# Altium schematic symbol library TI Power Management Shunt Voltage Reference.SchLib: 1526 symbols (part 12 of 18) (continued)
## TL1431QD
designator U?
Precision Adjustable (Programmable) Shunt Reference, 23 ppm / degC, 100 mA, -40 to 125 degC, 8-pin SOIC (D), Green (RoHS & no Sb/Br); Manufacturer: Texas Instruments; PartNumber: TL1431QD; Initial Accuracy @ 25/deg C(%): 0.4; Iout/Iz(Max)(mA): 100; Min Iz for Regulation(uA): 1000; Rating: Catalog; SubFamily: Shunt Voltage Reference; Temp Coeff(Max)(ppm/ degree C): 114; Temp Coeff(Typ)(ppm/ degree C): 23; VO Adj(Max)(V): 36; VO Adj(Min)(V): 2.5; DatasheetVersion: SLVS062M; PackageVersion: 4040047-3/M; PackageReference: D8; PackageDescription: 8-Pin Plastic Small Outline, Body 4.9 x 3.9 mm, Pitch 1.27 mm; Supplier 1: Digi-Key; Supplier Part Number 1: 296-10131-5-ND; Supplier 2: Farnell; Supplier Part Number 2: 1652377; Supplier 3: Newark; Supplier Part Number 3: 35K1266; Supplier 4: Mouser; Supplier Part Number 4: 595-TL1431QD; Eco-Plan: Green (RoHS & no Sb/Br); Mounting Technology: Surface Mount; Code_JEDEC: MS-012; ComponentLink1Description: Manufacturer URL; ComponentLink1URL: http://www.ti.com/; ComponentLink2Description: Datasheet; ComponentLink2URL: http://www.ti.com/general/docs/lit/getliterature.tsp?genericPartNumber=TL1431&fileType=pdf; ComponentLink3Description: Package Specification; ComponentLink3URL: http://www.ti.com/litv/pdf/msoi002j
footprint TI-D8_N (SOIC, 8-Leads, Body 4.9x3.9mm, Pitch 1.27mm, IPC Medium Density)
part A pins: 1 CATHODE, 2 ANODE, 3 ANODE, 6 ANODE, 7 ANODE, 8 REF (in)
part B pins: 4 NC, 5 NC

## TL1431QDG4
designator U?
Precision Adjustable (Programmable) Shunt Reference, 23 ppm / degC, 100 mA, -40 to 125 degC, 8-pin SOIC (D), Green (RoHS & no Sb/Br); Manufacturer: Texas Instruments; PartNumber: TL1431QDG4; Initial Accuracy @ 25/deg C(%): 0.4; Iout/Iz(Max)(mA): 100; Min Iz for Regulation(uA): 1000; Rating: Catalog; SubFamily: Shunt Voltage Reference; Temp Coeff(Max)(ppm/ degree C): 114; Temp Coeff(Typ)(ppm/ degree C): 23; VO Adj(Max)(V): 36; VO Adj(Min)(V): 2.5; DatasheetVersion: SLVS062M; PackageVersion: 4040047-3/M; PackageReference: D8; PackageDescription: 8-Pin Plastic Small Outline, Body 4.9 x 3.9 mm, Pitch 1.27 mm; Supplier 1: Digi-Key; Supplier Part Number 1: 296-22044-5-ND; Supplier 2: Newark; Supplier Part Number 2: 54M7381; Supplier 3: Mouser; Supplier Part Number 3: 595-TL1431QDG4; Eco-Plan: Green (RoHS & no Sb/Br); Mounting Technology: Surface Mount; Code_JEDEC: MS-012; ComponentLink1Description: Manufacturer URL; ComponentLink1URL: http://www.ti.com/; ComponentLink2Description: Datasheet; ComponentLink2URL: http://www.ti.com/general/docs/lit/getliterature.tsp?genericPartNumber=TL1431&fileType=pdf; ComponentLink3Description: Package Specification; ComponentLink3URL: http://www.ti.com/litv/pdf/msoi002j
footprint TI-D8_N (SOIC, 8-Leads, Body 4.9x3.9mm, Pitch 1.27mm, IPC Medium Density)
part A pins: 1 CATHODE, 2 ANODE, 3 ANODE, 6 ANODE, 7 ANODE, 8 REF (in)
part B pins: 4 NC, 5 NC

## TL1431QDR
designator U?
Precision Adjustable (Programmable) Shunt Reference, 23 ppm / degC, 100 mA, -40 to 125 degC, 8-pin SOIC (D), Green (RoHS & no Sb/Br); Manufacturer: Texas Instruments; PartNumber: TL1431QDR; Initial Accuracy @ 25/deg C(%): 0.4; Iout/Iz(Max)(mA): 100; Min Iz for Regulation(uA): 1000; Rating: Catalog; SubFamily: Shunt Voltage Reference; Temp Coeff(Max)(ppm/ degree C): 114; Temp Coeff(Typ)(ppm/ degree C): 23; VO Adj(Max)(V): 36; VO Adj(Min)(V): 2.5; DatasheetVersion: SLVS062M; PackageVersion: 4040047-3/M; PackageReference: D8; PackageDescription: 8-Pin Plastic Small Outline, Body 4.9 x 3.9 mm, Pitch 1.27 mm; Supplier 1: Digi-Key; Supplier Part Number 1: 296-17021-2-ND; Supplier 2: Digi-Key; Supplier Part Number 2: 296-17021-1-ND; Supplier 3: Digi-Key; Supplier Part Number 3: 296-17021-6-ND; Supplier 4: Newark; Supplier Part Number 4: 76C9144; Supplier 5: Mouser; Supplier Part Number 5: 595-TL1431QDR; Eco-Plan: Green (RoHS & no Sb/Br); Mounting Technology: Surface Mount; Code_JEDEC: MS-012; ComponentLink1Description: Manufacturer URL; ComponentLink1URL: http://www.ti.com/; ComponentLink2Description: Datasheet; ComponentLink2URL: http://www.ti.com/general/docs/lit/getliterature.tsp?genericPartNumber=TL1431&fileType=pdf; ComponentLink3Description: Package Specification; ComponentLink3URL: http://www.ti.com/litv/pdf/msoi002j
footprint TI-D8_N (SOIC, 8-Leads, Body 4.9x3.9mm, Pitch 1.27mm, IPC Medium Density)
part A pins: 1 CATHODE, 2 ANODE, 3 ANODE, 6 ANODE, 7 ANODE, 8 REF (in)
part B pins: 4 NC, 5 NC

## TL1431QDREP
designator U?
Enhanced Product Precision Adjustable (Programmable) Shunt Reference, 100 mA, -40 to 125 degC, 8-pin SOIC (D), Green (RoHS & no Sb/Br); Manufacturer: Texas Instruments; PartNumber: TL1431QDREP; Initial Accuracy @ 25/deg C(%): 0.4; Iout/Iz(Max)(mA): 100; Min Iz for Regulation(uA): 1000; Rating: HiRel Enhanced Product; SubFamily: Shunt Voltage Reference; VO Adj(Max)(V): 36; VO Adj(Min)(V): 2.5; DatasheetVersion: SLVS529C; PackageVersion: 4040047-3/M; PackageReference: D8; PackageDescription: 8-Pin Plastic Small Outline, Body 4.9 x 3.9 mm, Pitch 1.27 mm; Supplier 1: Digi-Key; Supplier Part Number 1: 296-18135-2-ND; Supplier 2: Digi-Key; Supplier Part Number 2: 296-18135-1-ND; Supplier 3: Digi-Key; Supplier Part Number 3: 296-18135-6-ND; Supplier 4: Newark; Supplier Part Number 4: 46M0971; Supplier 5: Mouser; Supplier Part Number 5: 595-TL1431QDREP; Eco-Plan: Green (RoHS & no Sb/Br); Mounting Technology: Surface Mount; Code_JEDEC: MS-012; ComponentLink1Description: Manufacturer URL; ComponentLink1URL: http://www.ti.com/; ComponentLink2Description: Datasheet; ComponentLink2URL: http://www.ti.com/general/docs/lit/getliterature.tsp?genericPartNumber=TL1431-EP&fileType=pdf; ComponentLink3Description: Package Specification; ComponentLink3URL: http://www.ti.com/litv/pdf/msoi002j; ComponentLink4Description: URL Link1; ComponentLink4URL: Samples URL:http://www.ti.com/product/tl1431-ep
footprint TI-D8_N (SOIC, 8-Leads, Body 4.9x3.9mm, Pitch 1.27mm, IPC Medium Density)
part A pins: 1 CATHODE, 2 ANODE, 3 ANODE, 6 ANODE, 7 ANODE, 8 REF (in)
part B pins: 4 NC, 5 NC

## TL1431QDRG4
designator U?
Precision Adjustable (Programmable) Shunt Reference, 23 ppm / degC, 100 mA, -40 to 125 degC, 8-pin SOIC (D), Green (RoHS & no Sb/Br); Manufacturer: Texas Instruments; PartNumber: TL1431QDRG4; Initial Accuracy @ 25/deg C(%): 0.4; Iout/Iz(Max)(mA): 100; Min Iz for Regulation(uA): 1000; Rating: Catalog; SubFamily: Shunt Voltage Reference; Temp Coeff(Max)(ppm/ degree C): 114; Temp Coeff(Typ)(ppm/ degree C): 23; VO Adj(Max)(V): 36; VO Adj(Min)(V): 2.5; DatasheetVersion: SLVS062M; PackageVersion: 4040047-3/M; PackageReference: D8; PackageDescription: 8-Pin Plastic Small Outline, Body 4.9 x 3.9 mm, Pitch 1.27 mm; Supplier 1: Digi-Key; Supplier Part Number 1: 296-31943-2-ND; Supplier 2: Digi-Key; Supplier Part Number 2: 296-31943-1-ND; Supplier 3: Digi-Key; Supplier Part Number 3: 296-31943-6-ND; Supplier 4: Newark; Supplier Part Number 4: 54M7382; Supplier 5: Mouser; Supplier Part Number 5: 595-TL1431QDRG4; Eco-Plan: Green (RoHS & no Sb/Br); Mounting Technology: Surface Mount; Code_JEDEC: MS-012; ComponentLink1Description: Manufacturer URL; ComponentLink1URL: http://www.ti.com/; ComponentLink2Description: Datasheet; ComponentLink2URL: http://www.ti.com/general/docs/lit/getliterature.tsp?genericPartNumber=TL1431&fileType=pdf; ComponentLink3Description: Package Specification; ComponentLink3URL: http://www.ti.com/litv/pdf/msoi002j
footprint TI-D8_N (SOIC, 8-Leads, Body 4.9x3.9mm, Pitch 1.27mm, IPC Medium Density)
part A pins: 1 CATHODE, 2 ANODE, 3 ANODE, 6 ANODE, 7 ANODE, 8 REF (in)
part B pins: 4 NC, 5 NC

## TL1431QDRG4Q1
designator U?
Automotive Catalog Precision Adjustable (Programmable) Shunt Reference, 100 mA, -40 to 125 degC, 8-pin SOIC (D), Green (RoHS & no Sb/Br); Manufacturer: Texas Instruments; PartNumber: TL1431QDRG4Q1; Initial Accuracy @ 25/deg C(%): 0.4; Iout/Iz(Max)(mA): 100; Min Iz for Regulation(uA): 1000; SubFamily: Shunt Voltage Reference; VO Adj(Max)(V): 36; VO Adj(Min)(V): 2.5; DatasheetVersion: SLVS534B; PackageVersion: 4040047-3/M; PackageReference: D8; PackageDescription: 8-Pin Plastic Small Outline, Body 4.9 x 3.9 mm, Pitch 1.27 mm; Supplier 1: Digi-Key; Supplier Part Number 1: TL1431QDRG4Q1-ND; Supplier 2: Mouser; Supplier Part Number 2: 595-TL1431QDRG4Q1; Eco-Plan: Green (RoHS & no Sb/Br); Rating: Automotive; Mounting Technology: Surface Mount; Code_JEDEC: MS-012; ComponentLink1Description: Manufacturer URL; ComponentLink1URL: http://www.ti.com/; ComponentLink2Description: Datasheet; ComponentLink2URL: http://www.ti.com/general/docs/lit/getliterature.tsp?genericPartNumber=TL1431-Q1&fileType=pdf; ComponentLink3Description: Package Specification; ComponentLink3URL: http://www.ti.com/litv/pdf/msoi002j
footprint TI-D8_N (SOIC, 8-Leads, Body 4.9x3.9mm, Pitch 1.27mm, IPC Medium Density)
part A pins: 1 CATHODE, 2 ANODE, 3 ANODE, 6 ANODE, 7 ANODE, 8 REF (in)
part B pins: 4 NC, 5 NC

## TL1431QDRQ1
designator U?
Automotive Catalog Precision Adjustable (Programmable) Shunt Reference, 100 mA, -40 to 125 degC, 8-pin SOIC (D), Green (RoHS & no Sb/Br); Manufacturer: Texas Instruments; PartNumber: TL1431QDRQ1; Initial Accuracy @ 25/deg C(%): 0.4; Iout/Iz(Max)(mA): 100; Min Iz for Regulation(uA): 1000; SubFamily: Shunt Voltage Reference; VO Adj(Max)(V): 36; VO Adj(Min)(V): 2.5; DatasheetVersion: SLVS534B; PackageVersion: 4040047-3/M; PackageReference: D8; PackageDescription: 8-Pin Plastic Small Outline, Body 4.9 x 3.9 mm, Pitch 1.27 mm; Supplier 1: Digi-Key; Supplier Part Number 1: 296-21093-2-ND; Supplier 2: Digi-Key; Supplier Part Number 2: 296-21093-1-ND; Supplier 3: Digi-Key; Supplier Part Number 3: 296-21093-6-ND; Supplier 4: Newark; Supplier Part Number 4: 28K5683; Supplier 5: Mouser; Supplier Part Number 5: 595-TL1431QDRQ1; Eco-Plan: Green (RoHS & no Sb/Br); Rating: Automotive; Mounting Technology: Surface Mount; Code_JEDEC: MS-012; ComponentLink1Description: Manufacturer URL; ComponentLink1URL: http://www.ti.com/; ComponentLink2Description: Datasheet; ComponentLink2URL: http://www.ti.com/general/docs/lit/getliterature.tsp?genericPartNumber=TL1431-Q1&fileType=pdf; ComponentLink3Description: Package Specification; ComponentLink3URL: http://www.ti.com/litv/pdf/msoi002j
footprint TI-D8_N (SOIC, 8-Leads, Body 4.9x3.9mm, Pitch 1.27mm, IPC Medium Density)
part A pins: 1 CATHODE, 2 ANODE, 3 ANODE, 6 ANODE, 7 ANODE, 8 REF (in)
part B pins: 4 NC, 5 NC

## TL1431QPWR
designator U?
Precision Adjustable (Programmable) Shunt Reference, 23 ppm / degC, 100 mA, -40 to 125 degC, 8-pin TSSOP (PW), Green (RoHS & no Sb/Br); Manufacturer: Texas Instruments; PartNumber: TL1431QPWR; Initial Accuracy @ 25/deg C(%): 0.4; Iout/Iz(Max)(mA): 100; Min Iz for Regulation(uA): 1000; Rating: Catalog; SubFamily: Shunt Voltage Reference; Temp Coeff(Max)(ppm/ degree C): 114; Temp Coeff(Typ)(ppm/ degree C): 23; VO Adj(Max)(V): 36; VO Adj(Min)(V): 2.5; DatasheetVersion: SLVS062M; PackageVersion: 4040064-2/G; PackageReference: PW8; PackageDescription: 8-Pin Plastic Small Outline, Body 4.4 x 3 mm, Pitch 0.65 mm; Supplier 1: Digi-Key; Supplier Part Number 1: TL1431QPWR-ND; Supplier 2: Mouser; Supplier Part Number 2: 595-TL1431QPWR; Eco-Plan: Green (RoHS & no Sb/Br); Mounting Technology: Surface Mount; Code_JEDEC: MO-153; ComponentLink1Description: Manufacturer URL; ComponentLink1URL: http://www.ti.com/; ComponentLink2Description: Datasheet; ComponentLink2URL: http://www.ti.com/general/docs/lit/getliterature.tsp?genericPartNumber=TL1431&fileType=pdf; ComponentLink3Description: Package Specification; ComponentLink3URL: http://www.ti.com/litv/pdf/mtss001d
footprint TI-PW8_N (SOP, 8-Leads, Body 4.4x3mm, Pitch 0.65mm, IPC Medium Density)
part A pins: 1 CATHODE, 6 ANODE, 8 REF (in)
part B pins: 2 NC "No internal connection", 3 NC "No internal connection", 4 NC "No internal connection", 5 NC "No internal connection", 7 NC "No internal connection"

## TL1431QPWRG4
designator U?
Precision Adjustable (Programmable) Shunt Reference, 23 ppm / degC, 100 mA, -40 to 125 degC, 8-pin TSSOP (PW), Green (RoHS & no Sb/Br); Manufacturer: Texas Instruments; PartNumber: TL1431QPWRG4; Initial Accuracy @ 25/deg C(%): 0.4; Iout/Iz(Max)(mA): 100; Min Iz for Regulation(uA): 1000; Rating: Catalog; SubFamily: Shunt Voltage Reference; Temp Coeff(Max)(ppm/ degree C): 114; Temp Coeff(Typ)(ppm/ degree C): 23; VO Adj(Max)(V): 36; VO Adj(Min)(V): 2.5; DatasheetVersion: SLVS062M; PackageVersion: 4040064-2/G; PackageReference: PW8; PackageDescription: 8-Pin Plastic Small Outline, Body 4.4 x 3 mm, Pitch 0.65 mm; Supplier 1: Digi-Key; Supplier Part Number 1: TL1431QPWRG4-ND; Supplier 2: Mouser; Supplier Part Number 2: 595-TL1431QPWRG4; Eco-Plan: Green (RoHS & no Sb/Br); Mounting Technology: Surface Mount; Code_JEDEC: MO-153; ComponentLink1Description: Manufacturer URL; ComponentLink1URL: http://www.ti.com/; ComponentLink2Description: Datasheet; ComponentLink2URL: http://www.ti.com/general/docs/lit/getliterature.tsp?genericPartNumber=TL1431&fileType=pdf; ComponentLink3Description: Package Specification; ComponentLink3URL: http://www.ti.com/litv/pdf/mtss001d
footprint TI-PW8_N (SOP, 8-Leads, Body 4.4x3mm, Pitch 0.65mm, IPC Medium Density)
part A pins: 1 CATHODE, 6 ANODE, 8 REF (in)
part B pins: 2 NC "No internal connection", 3 NC "No internal connection", 4 NC "No internal connection", 5 NC "No internal connection", 7 NC "No internal connection"

## TL4050A10IDBZR
designator U?
Precision Micropower Shunt Voltage Reference, -40 to 85 degC, 3-pin SOT-23 (DBZ), Green (RoHS & no Sb/Br); Manufacturer: Texas Instruments; PartNumber: TL4050A10IDBZR; Initial Accuracy @ 25/deg C(%): 0.1; Rating: Catalog; VO(V): 10; DatasheetVersion: SLOS486A; PackageVersion: 4203227/B; PackageReference: DBZ3; PackageDescription: 3-Pin Plastic Small Outline, Body 2.92 x 1.3 mm, Pitch 0.95 mm; Supplier 1: Digi-Key; Supplier Part Number 1: 296-22779-2-ND; Supplier 2: Digi-Key; Supplier Part Number 2: 296-22779-1-ND; Supplier 3: Digi-Key; Supplier Part Number 3: 296-22779-6-ND; Supplier 4: Newark; Supplier Part Number 4: 41M5669; Supplier 5: Mouser; Supplier Part Number 5: 595-TL4050A10IDBZR; Eco-Plan: Green (RoHS & no Sb/Br); SubFamily: Shunt Voltage Reference; Mounting Technology: Surface Mount; Code_JEDEC: TO-236; ComponentLink1Description: Manufacturer URL; ComponentLink1URL: http://www.ti.com/; ComponentLink2Description: Datasheet; ComponentLink2URL: http://www.ti.com/general/docs/lit/getliterature.tsp?genericPartNumber=TL4050A10&fileType=pdf; ComponentLink3Description: Package Specification; ComponentLink3URL: http://www.ti.com/litv/pdf/mpds108a
footprint TI-DBZ3_N (SOT23, 3-Leads, Body 2.92x1.3 mm, Pitch 0.95 mm, IPC Medium Density)
pins: 1 CATHODE, 2 ANODE, 3 NC

## TL4050A10IDBZRG4
designator U?
Precision Micropower Shunt Voltage Reference, -40 to 85 degC, 3-pin SOT-23 (DBZ), Green (RoHS & no Sb/Br); Manufacturer: Texas Instruments; PartNumber: TL4050A10IDBZRG4; Initial Accuracy @ 25/deg C(%): 0.1; Rating: Catalog; Temp Coeff(Typ)(ppm/ degree C): 50; VO(V): 10; DatasheetVersion: SLOS486A; PackageVersion: 4203227/B; PackageReference: DBZ3; PackageDescription: 3-Pin Plastic Small Outline, Body 2.92 x 1.3 mm, Pitch 0.95 mm; Supplier 1: Digi-Key; Supplier Part Number 1: TL4050A10IDBZRG4-ND; Supplier 2: Newark; Supplier Part Number 2: 46M0977; Supplier 3: Mouser; Supplier Part Number 3: 595-TL4050A10IDBZRG4; Eco-Plan: Green (RoHS & no Sb/Br); SubFamily: Shunt Voltage Reference; Mounting Technology: Surface Mount; Code_JEDEC: TO-236; ComponentLink1Description: Manufacturer URL; ComponentLink1URL: http://www.ti.com/; ComponentLink2Description: Datasheet; ComponentLink2URL: http://www.ti.com/general/docs/lit/getliterature.tsp?genericPartNumber=TL4050A10&fileType=pdf; ComponentLink3Description: Package Specification; ComponentLink3URL: http://www.ti.com/litv/pdf/mpds108a
footprint TI-DBZ3_N (SOT23, 3-Leads, Body 2.92x1.3 mm, Pitch 0.95 mm, IPC Medium Density)
pins: 1 CATHODE, 2 ANODE, 3 NC

## TL4050A10IDBZT
designator U?
Precision Micropower Shunt Voltage Reference, -40 to 85 degC, 3-pin SOT-23 (DBZ), Green (RoHS & no Sb/Br); Manufacturer: Texas Instruments; PartNumber: TL4050A10IDBZT; Initial Accuracy @ 25/deg C(%): 0.1; Rating: Catalog; Temp Coeff(Typ)(ppm/ degree C): 50; VO(V): 10; DatasheetVersion: SLOS486A; PackageVersion: 4203227/B; PackageReference: DBZ3; PackageDescription: 3-Pin Plastic Small Outline, Body 2.92 x 1.3 mm, Pitch 0.95 mm; Supplier 1: Digi-Key; Supplier Part Number 1: TL4050A10IDBZT-ND; Supplier 2: Farnell; Supplier Part Number 2: 1755349; Supplier 3: Mouser; Supplier Part Number 3: 595-TL4050A10IDBZT; Eco-Plan: Green (RoHS & no Sb/Br); SubFamily: Shunt Voltage Reference; Mounting Technology: Surface Mount; Code_JEDEC: TO-236; ComponentLink1Description: Manufacturer URL; ComponentLink1URL: http://www.ti.com/; ComponentLink2Description: Datasheet; ComponentLink2URL: http://www.ti.com/general/docs/lit/getliterature.tsp?genericPartNumber=TL4050A10&fileType=pdf; ComponentLink3Description: Package Specification; ComponentLink3URL: http://www.ti.com/litv/pdf/mpds108a
footprint TI-DBZ3_N (SOT23, 3-Leads, Body 2.92x1.3 mm, Pitch 0.95 mm, IPC Medium Density)
pins: 1 CATHODE, 2 ANODE, 3 NC

## TL4050A10IDBZTG4
designator U?
Precision Micropower Shunt Voltage Reference, -40 to 85 degC, 3-pin SOT-23 (DBZ), Green (RoHS & no Sb/Br); Manufacturer: Texas Instruments; PartNumber: TL4050A10IDBZTG4; Initial Accuracy @ 25/deg C(%): 0.1; Rating: Catalog; VO(V): 10; DatasheetVersion: SLOS486A; PackageVersion: 4203227/B; PackageReference: DBZ3; PackageDescription: 3-Pin Plastic Small Outline, Body 2.92 x 1.3 mm, Pitch 0.95 mm; Supplier 1: Digi-Key; Supplier Part Number 1: TL4050A10IDBZTG4-ND; Supplier 2: Mouser; Supplier Part Number 2: 595-TL4050A10IDBZTG4; Eco-Plan: Green (RoHS & no Sb/Br); SubFamily: Shunt Voltage Reference; Mounting Technology: Surface Mount; Code_JEDEC: TO-236; ComponentLink1Description: Manufacturer URL; ComponentLink1URL: http://www.ti.com/; ComponentLink2Description: Datasheet; ComponentLink2URL: http://www.ti.com/general/docs/lit/getliterature.tsp?genericPartNumber=TL4050A10&fileType=pdf; ComponentLink3Description: Package Specification; ComponentLink3URL: http://www.ti.com/litv/pdf/mpds108a
footprint TI-DBZ3_N (SOT23, 3-Leads, Body 2.92x1.3 mm, Pitch 0.95 mm, IPC Medium Density)
pins: 1 CATHODE, 2 ANODE, 3 NC

## TL4050A10IDCKR
designator U?
Precision Micropower Shunt Voltage Reference, -40 to 85 degC, 5-pin SC70 (DCK), Green (RoHS & no Sb/Br); Manufacturer: Texas Instruments; PartNumber: TL4050A10IDCKR; Initial Accuracy @ 25/deg C(%): 0.1; Rating: Catalog; Temp Coeff(Typ)(ppm/ degree C): 50; VO(V): 10; DatasheetVersion: SLOS486A; PackageReference: DCK5; PackageDescription: 5-Pin Plastic Small-Outline Package, 2 x 1.3 mm Body, 0.65 mm Pitch, 2.1 mm Lead Span; Supplier 1: Digi-Key; Supplier Part Number 1: 296-22780-2-ND; Supplier 2: Digi-Key; Supplier Part Number 2: 296-22780-1-ND; Supplier 3: Digi-Key; Supplier Part Number 3: 296-22780-6-ND; Supplier 4: Newark; Supplier Part Number 4: 41M5671; Supplier 5: Mouser; Supplier Part Number 5: 595-TL4050A10IDCKR; Eco-Plan: Green (RoHS & no Sb/Br); SubFamily: Shunt Voltage Reference; Mounting Technology: Surface Mount; Code_JEDEC: MO-203; ComponentLink1Description: Manufacturer URL; ComponentLink1URL: http://www.ti.com/; ComponentLink2Description: Datasheet; ComponentLink2URL: http://www.ti.com/general/docs/lit/getliterature.tsp?genericPartNumber=TL4050A10&fileType=pdf; ComponentLink3Description: Package Specification; ComponentLink3URL: http://www.ti.com/litv/pdf/mpds025f
footprint TI-DCK5_N (SOT353, 5-Leads, Body 2x1.3mm, Pitch 0.65mm, Lead Span 2.1mm, IPC Medium Density)
part A pins: 1 ANODE, 3 CATHODE
part B pins: 2 NC, 4 NC, 5 NC

## TL4050A10IDCKRG4
designator U?
Precision Micropower Shunt Voltage Reference, -40 to 85 degC, 5-pin SC70 (DCK), Green (RoHS & no Sb/Br); Manufacturer: Texas Instruments; PartNumber: TL4050A10IDCKRG4; Initial Accuracy @ 25/deg C(%): 0.1; Rating: Catalog; Temp Coeff(Typ)(ppm/ degree C): 50; VO(V): 10; DatasheetVersion: SLOS486A; PackageReference: DCK5; PackageDescription: 5-Pin Plastic Small-Outline Package, 2 x 1.3 mm Body, 0.65 mm Pitch, 2.1 mm Lead Span; Supplier 1: Digi-Key; Supplier Part Number 1: TL4050A10IDCKRG4-ND; Supplier 2: Newark; Supplier Part Number 2: 46M9124; Supplier 3: Mouser; Supplier Part Number 3: 595-TL4050A10IDCKRG4; Eco-Plan: Green (RoHS & no Sb/Br); SubFamily: Shunt Voltage Reference; Mounting Technology: Surface Mount; Code_JEDEC: MO-203; ComponentLink1Description: Manufacturer URL; ComponentLink1URL: http://www.ti.com/; ComponentLink2Description: Datasheet; ComponentLink2URL: http://www.ti.com/general/docs/lit/getliterature.tsp?genericPartNumber=TL4050A10&fileType=pdf; ComponentLink3Description: Package Specification; ComponentLink3URL: http://www.ti.com/litv/pdf/mpds025f
footprint TI-DCK5_N (SOT353, 5-Leads, Body 2x1.3mm, Pitch 0.65mm, Lead Span 2.1mm, IPC Medium Density)
part A pins: 1 ANODE, 3 CATHODE
part B pins: 2 NC, 4 NC, 5 NC

## TL4050A10IDCKT
designator U?
Precision Micropower Shunt Voltage Reference, -40 to 85 degC, 5-pin SC70 (DCK), Green (RoHS & no Sb/Br); Manufacturer: Texas Instruments; PartNumber: TL4050A10IDCKT; Initial Accuracy @ 25/deg C(%): 0.1; Rating: Catalog; Temp Coeff(Typ)(ppm/ degree C): 50; VO(V): 10; DatasheetVersion: SLOS486A; PackageReference: DCK5; PackageDescription: 5-Pin Plastic Small-Outline Package, 2 x 1.3 mm Body, 0.65 mm Pitch, 2.1 mm Lead Span; Supplier 1: Digi-Key; Supplier Part Number 1: TL4050A10IDCKT-ND; Supplier 2: Mouser; Supplier Part Number 2: 595-TL4050A10IDCKT; Eco-Plan: Green (RoHS & no Sb/Br); SubFamily: Shunt Voltage Reference; Mounting Technology: Surface Mount; Code_JEDEC: MO-203; ComponentLink1Description: Manufacturer URL; ComponentLink1URL: http://www.ti.com/; ComponentLink2Description: Datasheet; ComponentLink2URL: http://www.ti.com/general/docs/lit/getliterature.tsp?genericPartNumber=TL4050A10&fileType=pdf; ComponentLink3Description: Package Specification; ComponentLink3URL: http://www.ti.com/litv/pdf/mpds025f
footprint TI-DCK5_N (SOT353, 5-Leads, Body 2x1.3mm, Pitch 0.65mm, Lead Span 2.1mm, IPC Medium Density)
part A pins: 1 ANODE, 3 CATHODE
part B pins: 2 NC, 4 NC, 5 NC

## TL4050A10IDCKTG4
designator U?
Precision Micropower Shunt Voltage Reference, -40 to 85 degC, 5-pin SC70 (DCK), Green (RoHS & no Sb/Br); Manufacturer: Texas Instruments; PartNumber: TL4050A10IDCKTG4; Initial Accuracy @ 25/deg C(%): 0.1; Rating: Catalog; VO(V): 10; DatasheetVersion: SLOS486A; PackageReference: DCK5; PackageDescription: 5-Pin Plastic Small-Outline Package, 2 x 1.3 mm Body, 0.65 mm Pitch, 2.1 mm Lead Span; Supplier 1: Digi-Key; Supplier Part Number 1: TL4050A10IDCKTG4-ND; Supplier 2: Newark; Supplier Part Number 2: 46M9125; Supplier 3: Mouser; Supplier Part Number 3: 595-TL4050A10IDCKTG4; Eco-Plan: Green (RoHS & no Sb/Br); SubFamily: Shunt Voltage Reference; Mounting Technology: Surface Mount; Code_JEDEC: MO-203; ComponentLink1Description: Manufacturer URL; ComponentLink1URL: http://www.ti.com/; ComponentLink2Description: Datasheet; ComponentLink2URL: http://www.ti.com/general/docs/lit/getliterature.tsp?genericPartNumber=TL4050A10&fileType=pdf; ComponentLink3Description: Package Specification; ComponentLink3URL: http://www.ti.com/litv/pdf/mpds025f
footprint TI-DCK5_N (SOT353, 5-Leads, Body 2x1.3mm, Pitch 0.65mm, Lead Span 2.1mm, IPC Medium Density)
part A pins: 1 ANODE, 3 CATHODE
part B pins: 2 NC, 4 NC, 5 NC

## TL4050A10QDBZR
designator U?
Precision Micropower Shunt Voltage Reference, -40 to 125 degC, 3-pin SOT-23 (DBZ), Green (RoHS & no Sb/Br); Manufacturer: Texas Instruments; PartNumber: TL4050A10QDBZR; Rating: Catalog; DatasheetVersion: SLOS486A; PackageVersion: 4203227/B; PackageReference: DBZ3; PackageDescription: 3-Pin Plastic Small Outline, Body 2.92 x 1.3 mm, Pitch 0.95 mm; Supplier 1: Digi-Key; Supplier Part Number 1: 296-22781-2-ND; Supplier 2: Digi-Key; Supplier Part Number 2: 296-22781-1-ND; Supplier 3: Digi-Key; Supplier Part Number 3: 296-22781-6-ND; Supplier 4: Newark; Supplier Part Number 4: 41M5673; Supplier 5: Mouser; Supplier Part Number 5: 595-TL4050A10QDBZR; Eco-Plan: Green (RoHS & no Sb/Br); SubFamily: Shunt Voltage Reference; Mounting Technology: Surface Mount; Code_JEDEC: TO-236; ComponentLink1Description: Manufacturer URL; ComponentLink1URL: http://www.ti.com/; ComponentLink2Description: Datasheet; ComponentLink2URL: http://www.ti.com/general/docs/lit/getliterature.tsp?genericPartNumber=TL4050A10&fileType=pdf; ComponentLink3Description: Package Specification; ComponentLink3URL: http://www.ti.com/litv/pdf/mpds108a
footprint TI-DBZ3_N (SOT23, 3-Leads, Body 2.92x1.3 mm, Pitch 0.95 mm, IPC Medium Density)
pins: 1 CATHODE, 2 ANODE, 3 NC

## TL4050A10QDBZRG4
designator U?
Precision Micropower Shunt Voltage Reference, -40 to 125 degC, 3-pin SOT-23 (DBZ), Green (RoHS & no Sb/Br); Manufacturer: Texas Instruments; PartNumber: TL4050A10QDBZRG4; Rating: Catalog; DatasheetVersion: SLOS486A; PackageVersion: 4203227/B; PackageReference: DBZ3; PackageDescription: 3-Pin Plastic Small Outline, Body 2.92 x 1.3 mm, Pitch 0.95 mm; Supplier 1: Digi-Key; Supplier Part Number 1: TL4050A10QDBZRG4-ND; Supplier 2: Newark; Supplier Part Number 2: 46M0979; Supplier 3: Mouser; Supplier Part Number 3: 595-TL4050A10QDBZRG4; Eco-Plan: Green (RoHS & no Sb/Br); SubFamily: Shunt Voltage Reference; Mounting Technology: Surface Mount; Code_JEDEC: TO-236; ComponentLink1Description: Manufacturer URL; ComponentLink1URL: http://www.ti.com/; ComponentLink2Description: Datasheet; ComponentLink2URL: http://www.ti.com/general/docs/lit/getliterature.tsp?genericPartNumber=TL4050A10&fileType=pdf; ComponentLink3Description: Package Specification; ComponentLink3URL: http://www.ti.com/litv/pdf/mpds108a
footprint TI-DBZ3_N (SOT23, 3-Leads, Body 2.92x1.3 mm, Pitch 0.95 mm, IPC Medium Density)
pins: 1 CATHODE, 2 ANODE, 3 NC

## TL4050A10QDBZT
designator U?
Precision Micropower Shunt Voltage Reference, -40 to 125 degC, 3-pin SOT-23 (DBZ), Green (RoHS & no Sb/Br); Manufacturer: Texas Instruments; PartNumber: TL4050A10QDBZT; Rating: Catalog; DatasheetVersion: SLOS486A; PackageVersion: 4203227/B; PackageReference: DBZ3; PackageDescription: 3-Pin Plastic Small Outline, Body 2.92 x 1.3 mm, Pitch 0.95 mm; Supplier 1: Digi-Key; Supplier Part Number 1: TL4050A10QDBZT-ND; Supplier 2: Mouser; Supplier Part Number 2: 595-TL4050A10QDBZT; Eco-Plan: Green (RoHS & no Sb/Br); SubFamily: Shunt Voltage Reference; Mounting Technology: Surface Mount; Code_JEDEC: TO-236; ComponentLink1Description: Manufacturer URL; ComponentLink1URL: http://www.ti.com/; ComponentLink2Description: Datasheet; ComponentLink2URL: http://www.ti.com/general/docs/lit/getliterature.tsp?genericPartNumber=TL4050A10&fileType=pdf; ComponentLink3Description: Package Specification; ComponentLink3URL: http://www.ti.com/litv/pdf/mpds108a
footprint TI-DBZ3_N (SOT23, 3-Leads, Body 2.92x1.3 mm, Pitch 0.95 mm, IPC Medium Density)
pins: 1 CATHODE, 2 ANODE, 3 NC

## TL4050A10QDBZTG4
designator U?
Precision Micropower Shunt Voltage Reference, -40 to 125 degC, 3-pin SOT-23 (DBZ), Green (RoHS & no Sb/Br); Manufacturer: Texas Instruments; PartNumber: TL4050A10QDBZTG4; Rating: Catalog; DatasheetVersion: SLOS486A; PackageVersion: 4203227/B; PackageReference: DBZ3; PackageDescription: 3-Pin Plastic Small Outline, Body 2.92 x 1.3 mm, Pitch 0.95 mm; Supplier 1: Digi-Key; Supplier Part Number 1: TL4050A10QDBZTG4-ND; Supplier 2: Mouser; Supplier Part Number 2: 595-TL4050A10QDBZTG4; Eco-Plan: Green (RoHS & no Sb/Br); SubFamily: Shunt Voltage Reference; Mounting Technology: Surface Mount; Code_JEDEC: TO-236; ComponentLink1Description: Manufacturer URL; ComponentLink1URL: http://www.ti.com/; ComponentLink2Description: Datasheet; ComponentLink2URL: http://www.ti.com/general/docs/lit/getliterature.tsp?genericPartNumber=TL4050A10&fileType=pdf; ComponentLink3Description: Package Specification; ComponentLink3URL: http://www.ti.com/litv/pdf/mpds108a
footprint TI-DBZ3_N (SOT23, 3-Leads, Body 2.92x1.3 mm, Pitch 0.95 mm, IPC Medium Density)
pins: 1 CATHODE, 2 ANODE, 3 NC

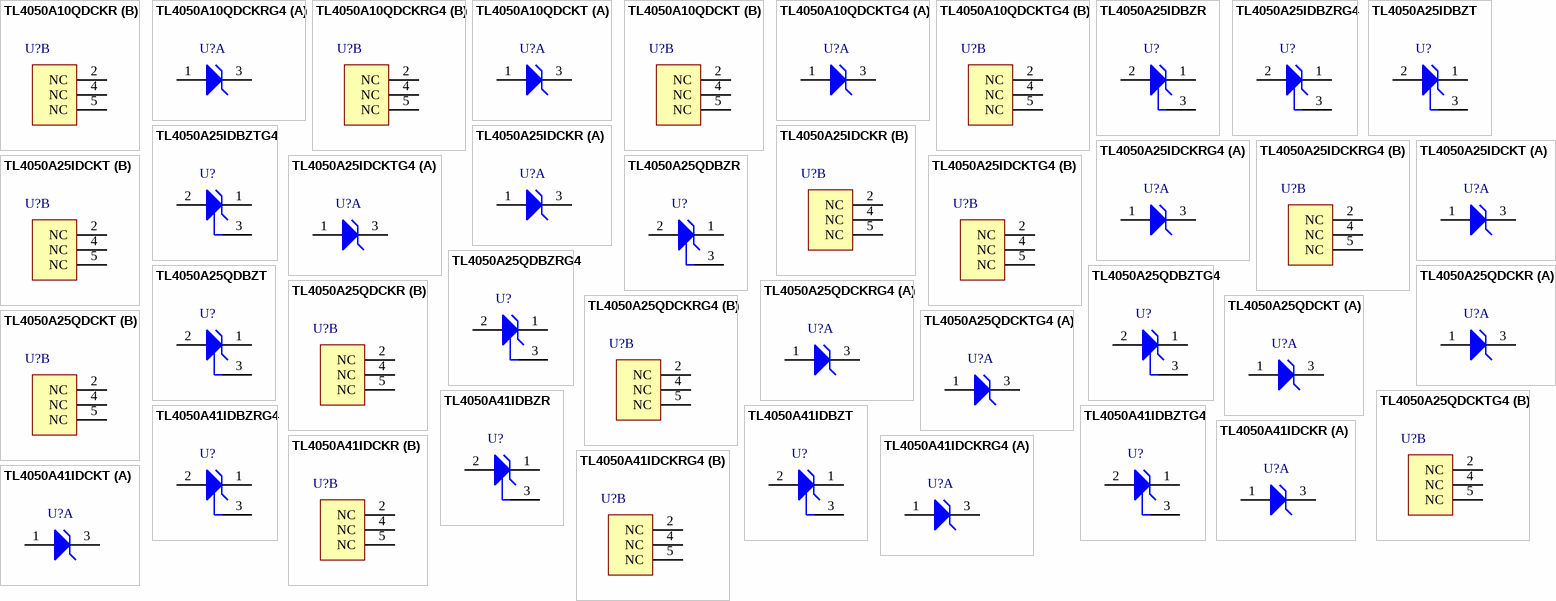
[diagram p37: symbols TL4050A10QDCKR to TL4050A41IDCKT]

## TL4050A10QDCKR
designator U?
Precision Micropower Shunt Voltage Reference, -40 to 125 degC, 5-pin SC70 (DCK), Green (RoHS & no Sb/Br); Manufacturer: Texas Instruments; PartNumber: TL4050A10QDCKR; Rating: Catalog; DatasheetVersion: SLOS486A; PackageReference: DCK5; PackageDescription: 5-Pin Plastic Small-Outline Package, 2 x 1.3 mm Body, 0.65 mm Pitch, 2.1 mm Lead Span; Supplier 1: Digi-Key; Supplier Part Number 1: 296-22782-2-ND; Supplier 2: Digi-Key; Supplier Part Number 2: 296-22782-1-ND; Supplier 3: Digi-Key; Supplier Part Number 3: 296-22782-6-ND; Supplier 4: Newark; Supplier Part Number 4: 41M5675; Supplier 5: Mouser; Supplier Part Number 5: 595-TL4050A10QDCKR; Eco-Plan: Green (RoHS & no Sb/Br); SubFamily: Shunt Voltage Reference; Mounting Technology: Surface Mount; Code_JEDEC: MO-203; ComponentLink1Description: Manufacturer URL; ComponentLink1URL: http://www.ti.com/; ComponentLink2Description: Datasheet; ComponentLink2URL: http://www.ti.com/general/docs/lit/getliterature.tsp?genericPartNumber=TL4050A10&fileType=pdf; ComponentLink3Description: Package Specification; ComponentLink3URL: http://www.ti.com/litv/pdf/mpds025f
footprint TI-DCK5_N (SOT353, 5-Leads, Body 2x1.3mm, Pitch 0.65mm, Lead Span 2.1mm, IPC Medium Density)
part A pins: 1 ANODE, 3 CATHODE
part B pins: 2 NC, 4 NC, 5 NC

## TL4050A10QDCKRG4
designator U?
Precision Micropower Shunt Voltage Reference, -40 to 125 degC, 5-pin SC70 (DCK), Green (RoHS & no Sb/Br); Manufacturer: Texas Instruments; PartNumber: TL4050A10QDCKRG4; Rating: Catalog; DatasheetVersion: SLOS486A; PackageReference: DCK5; PackageDescription: 5-Pin Plastic Small-Outline Package, 2 x 1.3 mm Body, 0.65 mm Pitch, 2.1 mm Lead Span; Supplier 1: Digi-Key; Supplier Part Number 1: TL4050A10QDCKRG4-ND; Supplier 2: Newark; Supplier Part Number 2: 46M9126; Supplier 3: Mouser; Supplier Part Number 3: 595-TL4050A10QDCKRG4; Eco-Plan: Green (RoHS & no Sb/Br); SubFamily: Shunt Voltage Reference; Mounting Technology: Surface Mount; Code_JEDEC: MO-203; ComponentLink1Description: Manufacturer URL; ComponentLink1URL: http://www.ti.com/; ComponentLink2Description: Datasheet; ComponentLink2URL: http://www.ti.com/general/docs/lit/getliterature.tsp?genericPartNumber=TL4050A10&fileType=pdf; ComponentLink3Description: Package Specification; ComponentLink3URL: http://www.ti.com/litv/pdf/mpds025f
footprint TI-DCK5_N (SOT353, 5-Leads, Body 2x1.3mm, Pitch 0.65mm, Lead Span 2.1mm, IPC Medium Density)
part A pins: 1 ANODE, 3 CATHODE
part B pins: 2 NC, 4 NC, 5 NC

## TL4050A10QDCKT
designator U?
Precision Micropower Shunt Voltage Reference, -40 to 125 degC, 5-pin SC70 (DCK), Green (RoHS & no Sb/Br); Manufacturer: Texas Instruments; PartNumber: TL4050A10QDCKT; Rating: Catalog; DatasheetVersion: SLOS486A; PackageReference: DCK5; PackageDescription: 5-Pin Plastic Small-Outline Package, 2 x 1.3 mm Body, 0.65 mm Pitch, 2.1 mm Lead Span; Supplier 1: Digi-Key; Supplier Part Number 1: TL4050A10QDCKT-ND; Supplier 2: Mouser; Supplier Part Number 2: 595-TL4050A10QDCKT; Eco-Plan: Green (RoHS & no Sb/Br); SubFamily: Shunt Voltage Reference; Mounting Technology: Surface Mount; Code_JEDEC: MO-203; ComponentLink1Description: Manufacturer URL; ComponentLink1URL: http://www.ti.com/; ComponentLink2Description: Datasheet; ComponentLink2URL: http://www.ti.com/general/docs/lit/getliterature.tsp?genericPartNumber=TL4050A10&fileType=pdf; ComponentLink3Description: Package Specification; ComponentLink3URL: http://www.ti.com/litv/pdf/mpds025f
footprint TI-DCK5_N (SOT353, 5-Leads, Body 2x1.3mm, Pitch 0.65mm, Lead Span 2.1mm, IPC Medium Density)
part A pins: 1 ANODE, 3 CATHODE
part B pins: 2 NC, 4 NC, 5 NC

## TL4050A10QDCKTG4
designator U?
Precision Micropower Shunt Voltage Reference, -40 to 125 degC, 5-pin SC70 (DCK), Green (RoHS & no Sb/Br); Manufacturer: Texas Instruments; PartNumber: TL4050A10QDCKTG4; Rating: Catalog; DatasheetVersion: SLOS486A; PackageReference: DCK5; PackageDescription: 5-Pin Plastic Small-Outline Package, 2 x 1.3 mm Body, 0.65 mm Pitch, 2.1 mm Lead Span; Supplier 1: Digi-Key; Supplier Part Number 1: TL4050A10QDCKTG4-ND; Supplier 2: Mouser; Supplier Part Number 2: 595-TL4050A10QDCKTG4; Eco-Plan: Green (RoHS & no Sb/Br); SubFamily: Shunt Voltage Reference; Mounting Technology: Surface Mount; Code_JEDEC: MO-203; ComponentLink1Description: Manufacturer URL; ComponentLink1URL: http://www.ti.com/; ComponentLink2Description: Datasheet; ComponentLink2URL: http://www.ti.com/general/docs/lit/getliterature.tsp?genericPartNumber=TL4050A10&fileType=pdf; ComponentLink3Description: Package Specification; ComponentLink3URL: http://www.ti.com/litv/pdf/mpds025f
footprint TI-DCK5_N (SOT353, 5-Leads, Body 2x1.3mm, Pitch 0.65mm, Lead Span 2.1mm, IPC Medium Density)
part A pins: 1 ANODE, 3 CATHODE
part B pins: 2 NC, 4 NC, 5 NC

## TL4050A25IDBZR
designator U?
Precision Micropower Shunt Voltage Reference, 2.5 V, 50 ppm / degC, -40 to 85 degC, 3-pin SOT-23 (DBZ), Green (RoHS & no Sb/Br); Manufacturer: Texas Instruments; PartNumber: TL4050A25IDBZR; Initial Accuracy @ 25/deg C(%): 0.1; Rating: Catalog; Temp Coeff(Typ)(ppm/ degree C): 50; VO(V): 2.5; DatasheetVersion: SLOS486A; PackageVersion: 4203227/B; PackageReference: DBZ3; PackageDescription: 3-Pin Plastic Small Outline, Body 2.92 x 1.3 mm, Pitch 0.95 mm; Supplier 1: Digi-Key; Supplier Part Number 1: 296-22783-2-ND; Supplier 2: Digi-Key; Supplier Part Number 2: 296-22783-1-ND; Supplier 3: Digi-Key; Supplier Part Number 3: 296-22783-6-ND; Supplier 4: Newark; Supplier Part Number 4: 41M5677; Supplier 5: Mouser; Supplier Part Number 5: 595-TL4050A25IDBZR; Eco-Plan: Green (RoHS & no Sb/Br); SubFamily: Shunt Voltage Reference; Mounting Technology: Surface Mount; Code_JEDEC: TO-236; ComponentLink1Description: Manufacturer URL; ComponentLink1URL: http://www.ti.com/; ComponentLink2Description: Datasheet; ComponentLink2URL: http://www.ti.com/general/docs/lit/getliterature.tsp?genericPartNumber=TL4050A25&fileType=pdf; ComponentLink3Description: Package Specification; ComponentLink3URL: http://www.ti.com/litv/pdf/mpds108a
footprint TI-DBZ3_N (SOT23, 3-Leads, Body 2.92x1.3 mm, Pitch 0.95 mm, IPC Medium Density)
pins: 1 CATHODE, 2 ANODE, 3 NC

## TL4050A25IDBZRG4
designator U?
Precision Micropower Shunt Voltage Reference, 2.5 V, 50 ppm / degC, -40 to 85 degC, 3-pin SOT-23 (DBZ), Green (RoHS & no Sb/Br); Manufacturer: Texas Instruments; PartNumber: TL4050A25IDBZRG4; Initial Accuracy @ 25/deg C(%): 0.1; Rating: Catalog; Temp Coeff(Typ)(ppm/ degree C): 50; VO(V): 2.5; DatasheetVersion: SLOS486A; PackageVersion: 4203227/B; PackageReference: DBZ3; PackageDescription: 3-Pin Plastic Small Outline, Body 2.92 x 1.3 mm, Pitch 0.95 mm; Supplier 1: Digi-Key; Supplier Part Number 1: TL4050A25IDBZRG4-ND; Supplier 2: Newark; Supplier Part Number 2: 46M0981; Supplier 3: Mouser; Supplier Part Number 3: 595-TL4050A25IDBZRG4; Eco-Plan: Green (RoHS & no Sb/Br); SubFamily: Shunt Voltage Reference; Mounting Technology: Surface Mount; Code_JEDEC: TO-236; ComponentLink1Description: Manufacturer URL; ComponentLink1URL: http://www.ti.com/; ComponentLink2Description: Datasheet; ComponentLink2URL: http://www.ti.com/general/docs/lit/getliterature.tsp?genericPartNumber=TL4050A25&fileType=pdf; ComponentLink3Description: Package Specification; ComponentLink3URL: http://www.ti.com/litv/pdf/mpds108a
footprint TI-DBZ3_N (SOT23, 3-Leads, Body 2.92x1.3 mm, Pitch 0.95 mm, IPC Medium Density)
pins: 1 CATHODE, 2 ANODE, 3 NC
